# Altium schematic symbol library IC.SchLib: 555 symbols (part 10 of 15)
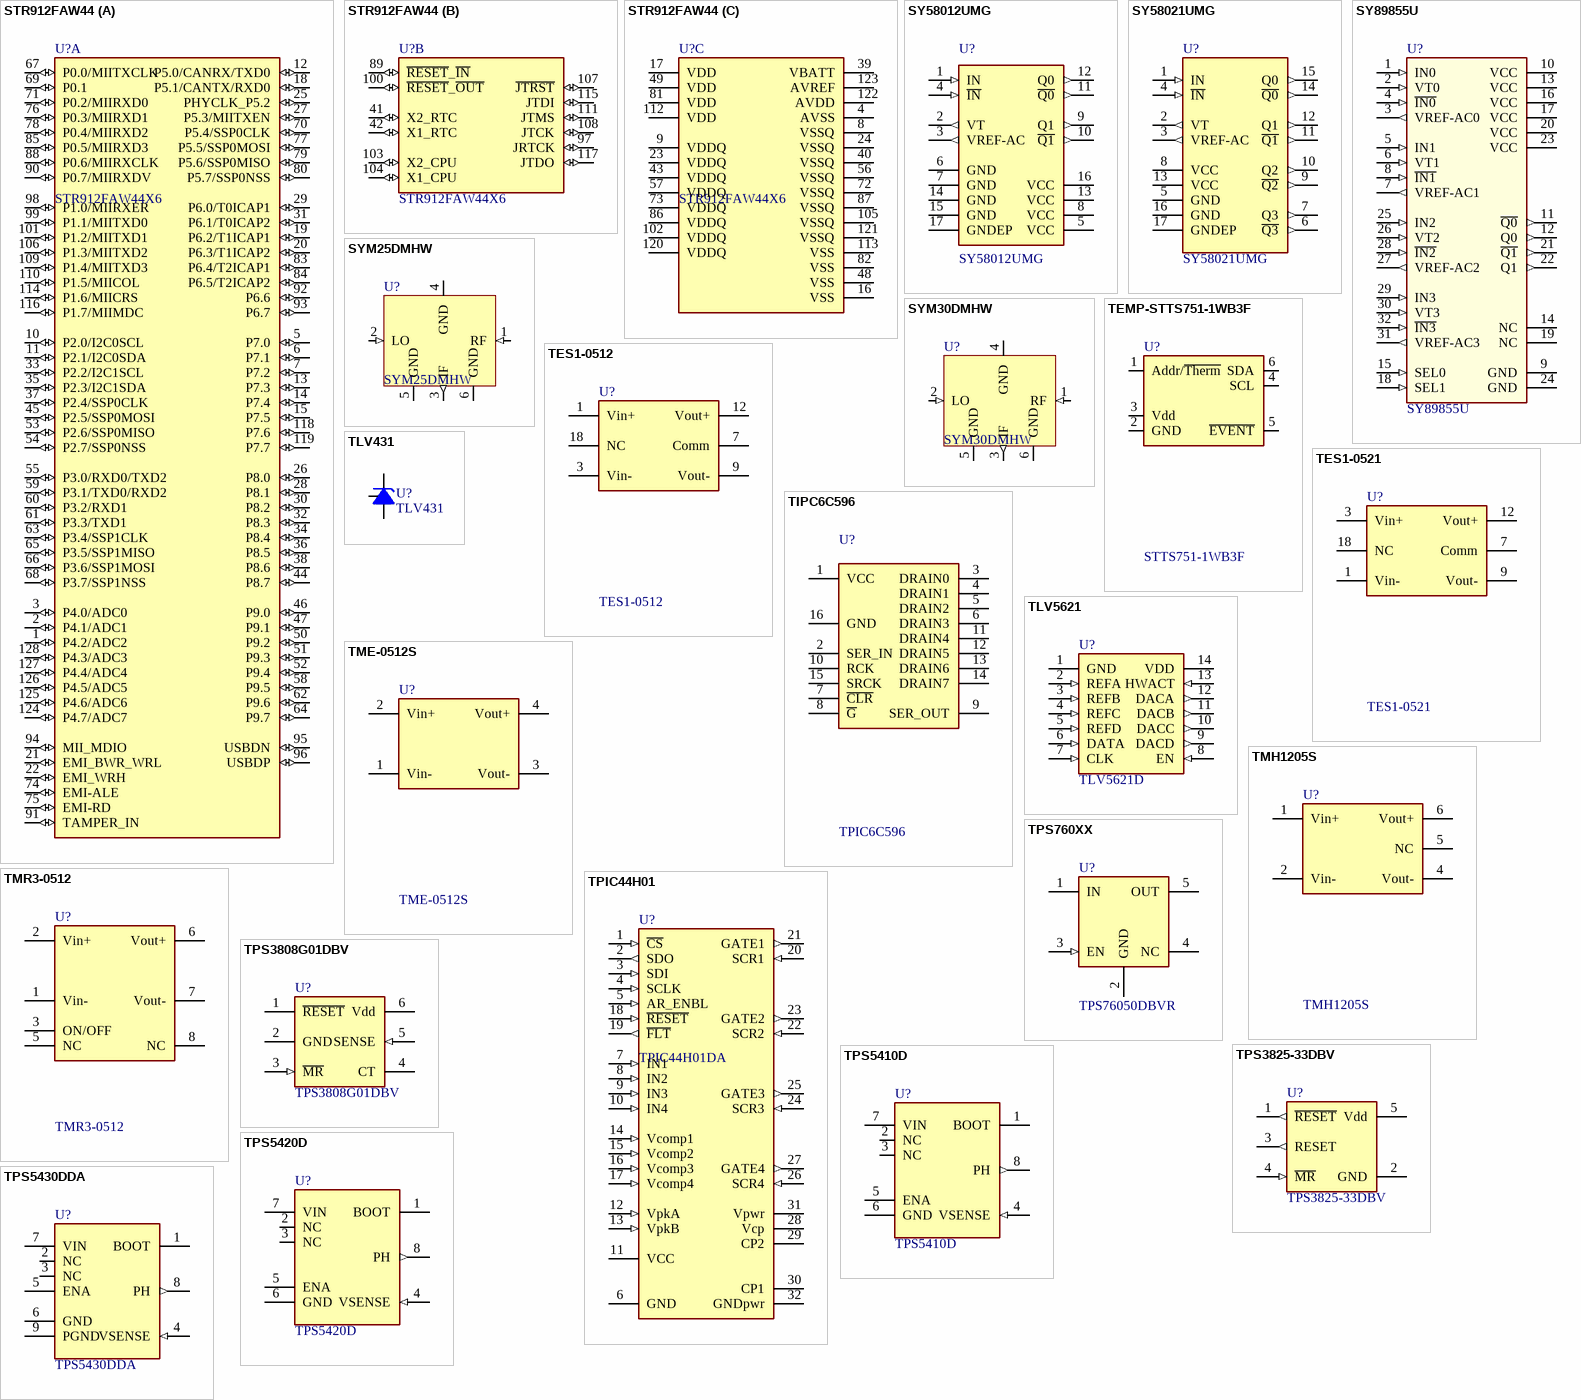
[diagram p79: symbols STR912FAW44 to TPS5430DDA]

## STR912FAW44
designator U?, comment STR912FAW44X6
ARM7 16/32-Bit Microcontroller, 512KB Flash, 96KB RAM, Ethernet, USB2, 128-Lead LQFP; Manufacturer: ST Microelectronics; Sort: 510; Tech: SMDR; Package: LQFP128; Manufacturer No: STR912FAW44X6; Price: 0
footprint TSQFP40P1600X1600X160-128N (TSQFP, 128-Leads, Body 16,2x16,2mm (max), Pitch 0,40mm, IPC Medium Density)
part A pins: 1 P4.2/ADC2 (io), 2 P4.1/ADC1 (io), 3 P4.0/ADC0 (io), 5 P7.0 (io), 6 P7.1 (io), 7 P7.2 (io), 10 P2.0/I2C0SCL (io), 11 P2.1/I2C0SDA (io), 12 P5.0/CANRX/TXD0 (io), 13 P7.3 (io), 14 P7.4 (io), 15 P7.5 (io), 18 P5.1/CANTX/RXD0 (io), 19 P6.2/T1ICAP1 (io), 20 P6.3/T1ICAP2 (io), 21 EMI_BWR_WRL (io), 22 EMI_WRH (io), 25 PHYCLK_P5.2 (io), 26 P8.0 (io), 27 P5.3/MIITXEN (io), 28 P8.1 (io), 29 P6.0/T0ICAP1 (io), 30 P8.2 (io), 31 P6.1/T0ICAP2 (io), 32 P8.3 (io), 33 P2.2/I2C1SCL (io), 34 P8.4 (io), 35 P2.3/I2C1SDA (io), 36 P8.5 (io), 37 P2.4/SSP0CLK (io), 38 P8.6 (io), 44 P8.7 (io), 45 P2.5/SSP0MOSI (io), 46 P9.0 (io), 47 P9.1 (io), 50 P9.2 (io), 51 P9.3 (io), 52 P9.4 (io), 53 P2.6/SSP0MISO (io), 54 P2.7/SSP0NSS (io), 55 P3.0/RXD0/TXD2 (io), 58 P9.5 (io), 59 P3.1/TXD0/RXD2 (io), 60 P3.2/RXD1 (io), 61 P3.3/TXD1 (io), 62 P9.6 (io), 63 P3.4/SSP1CLK (io), 64 P9.7 (io), 65 P3.5/SSP1MISO (io), 66 P3.6/SSP1MOSI (io), 67 P0.0/MIITXCLK (io), 68 P3.7/SSP1NSS (io), 69 P0.1 (io), 70 P5.4/SSP0CLK (io), 71 P0.2/MIIRXD0 (io), 74 EMI-ALE (io), 75 EMI-RD (io), 76 P0.3/MIIRXD1 (io), 77 P5.5/SSP0MOSI (io), 78 P0.4/MIIRXD2 (io), 79 P5.6/SSP0MISO (io), 80 P5.7/SSP0NSS (io), 83 P6.4/T2ICAP1 (io), 84 P6.5/T2ICAP2 (io), 85 P0.5/MIIRXD3 (io), 88 P0.6/MIIRXCLK (io), 90 P0.7/MIIRXDV (io), 91 TAMPER_IN (io), 92 P6.6 (io), 93 P6.7 (io), 94 MII_MDIO (io), 95 USBDN (io), 96 USBDP (io), 98 P1.0/MIIRXER (io), 99 P1.1/MIITXD0 (io), 101 P1.2/MIITXD1 (io), 106 P1.3/MIITXD2 (io), 109 P1.4/MIITXD3 (io), 110 P1.5/MIICOL (io), 114 P1.6/MIICRS (io), 116 P1.7/MIIMDC (io), 118 P7.6 (io), 119 P7.7 (io), 124 P4.7/ADC7 (io), 125 P4.6/ADC6 (io), 126 P4.5/ADC5 (io), 127 P4.4/ADC4 (io), 128 P4.3/ADC3 (io)
part B pins: 41 X2_RTC (io), 42 X1_RTC (io), 89 ~{RESET}_~{IN} (io), 97 JRTCK (io), 100 ~{RESET}_~{OUT} (io), 103 X2_CPU (io), 104 X1_CPU (io), 107 ~{JTRST} (io), 108 JTCK (io), 111 JTMS (io), 115 JTDI (io), 117 JTDO (io)
part C pins: 4 AVSS (power), 8 VSSQ (power), 9 VDDQ (power), 16 VSS (power), 17 VDD (power), 23 VDDQ (power), 24 VSSQ (power), 39 VBATT (power), 40 VSSQ (power), 43 VDDQ (power), 48 VSS (power), 49 VDD (power), 56 VSSQ (power), 57 VDDQ (power), 72 VSSQ (power), 73 VDDQ (power), 81 VDD (power), 82 VSS (power), 86 VDDQ (power), 87 VSSQ (power), 102 VDDQ (power), 105 VSSQ (power), 112 VDD (power), 113 VSS (power), 120 VDDQ (power), 121 VSSQ (power), 122 AVDD (power), 123 AVREF (power)

## SY58012UMG
designator U?
1:2 LVPECL fanout buffer / translator 2.5/3.3V; Manufacturer: Micrel; Sort: 510; Tech: SMDR; Manufacturer No: SY58012UMG; Package: MLF-16; Price: 0
footprint QFN16N-2 (QFN, 16-Leads, Body 3,0x3,0mm (max), Pitch 0,50mm, IPC Medium Density)
pins: 1 IN (in), 2 VT (out), 3 VREF-AC (out), 4 ~{IN} (in), 5 VCC (power), 6 GND (power), 7 GND (power), 8 VCC (power), 9 Q1 (out), 10 ~{Q1} (out), 11 ~{Q0} (out), 12 Q0 (out), 13 VCC (power), 14 GND (power), 15 GND (power), 16 VCC (power), 17 GNDEP (power)

## SY58021UMG
designator U?
1:4 LVPECL fanout buffer / translator 2.5/3.3V; Manufacturer: Micrel; Sort: 510; Tech: SMDR; Manufacturer No: SY58021UMG; Package: MLF-16 PREVERI!!!; Price: 0
footprint QFN16N-2 (QFN, 16-Leads, Body 3,0x3,0mm (max), Pitch 0,50mm, IPC Medium Density)
pins: 1 IN (in), 2 VT (out), 3 VREF-AC (out), 4 ~{IN} (in), 5 GND (power), 6 ~{Q3} (out), 7 Q3 (out), 8 VCC (power), 9 ~{Q2} (out), 10 Q2 (out), 11 ~{Q1} (out), 12 Q1 (out), 13 VCC (power), 14 ~{Q0} (out), 15 Q0 (out), 16 GND (power), 17 GNDEP (power)

## SY89855U
designator U?
Diff LVPECL 4:1 MUX with 1:2 Fanout and Internal Termination; Manufacturer: Micrel; Manufacturer No: SY89855UMG; Sort: 510; Tech: SMDR; Package: MLF32; Price: 0
footprint MLF32-1 (MLF 32pin W5.0x5.0mm H0.85mm R0.5mm  PP 3.1x3.1mm)
pins: 1 IN0 (in), 2 VT0 (in), 3 VREF-AC0 (out), 4 ~{IN0} (in), 5 IN1 (in), 6 VT1 (in), 7 VREF-AC1 (out), 8 ~{IN1} (in), 9 GND (power), 10 VCC (power), 11 ~{Q0} (out), 12 Q0 (out), 13 VCC (power), 14 NC, 15 SEL0 (in), 16 VCC (power), 17 VCC (power), 18 SEL1 (in), 19 NC, 20 VCC (power), 21 ~{Q1} (out), 22 Q1 (out), 23 VCC (power), 24 GND (power), 25 IN2 (in), 26 VT2 (in), 27 VREF-AC2 (out), 28 ~{IN2} (in), 29 IN3 (in), 30 VT3 (in), 31 VREF-AC3 (out), 32 ~{IN3} (in)

## SYM25DMHW
designator U?
Mixer, Level 13 (LO Power +13dBm) 40 to 2500MHz; Manufacturer: MiniCircuits; Sort: 510; Tech: SMDR; Manufacturer No: SYM25DMHW; Price: 0
footprint SYM30
pins: 1 RF (in), 2 LO (in), 3 IF (out), 4 GND (power), 5 GND (power), 6 GND (power)

## SYM30DMHW
designator U?
Frequency mixer 5-3000MHz Level 13; Manufacturer: MiniCircuits; Manufacturer No: SYM30DMHW+; Sort: 510; Tech: SMDR; Package: RF modul TTT167; Price: 0
footprint SYM30
pins: 1 RF (in), 2 LO (in), 3 IF (out), 4 GND (power), 5 GND (power), 6 GND (power)
1 alternate drawing of the same symbol

## TEMP-STTS751-1WB3F
designator U?, comment STTS751-1WB3F
2.25 V low-voltage local digital temperature sensor; Manufacturer: STMelectronics; Comment2: 2.25 to 3.6Vin; Sort: 510; Tech: SMDR; Manufacturer No: STTS751-1WB3F; Package: SOT23-6; Price: 1.8; Supplier: Digi-Key; Supplier No: 497-10662-1-ND
footprint SOT23-6
pins: 1 Addr/~{Therm}, 2 GND, 3 Vdd, 4 SCL, 5 ~{EVENT}, 6 SDA

## TES1-0512
designator U?
DC/DC converter, TES series, 1W Dual Output; Manufacturer: Traco Power; Sort: 510; Tech: SMDR; Manufacturer No: TES 1-0512; Price: 0
footprint TES1-0521 (TMH1205S 5 pin, Body 19.5x7.5x10.2mm (LxWxH), Pitch 2,54mm)
pins: 1 Vin+ (power), 3 Vin- (power), 7 Comm (power), 9 Vout- (power), 12 Vout+ (power), 18 NC

## TES1-0521
designator U?
DC/DC converter, TES series, 1W Dual Output; Manufacturer: Traco Power; Sort: 510; Tech: SMDR; Manufacturer No: TES 1-0521; Price: 0
footprint TES1-0521 (TMH1205S 5 pin, Body 19.5x7.5x10.2mm (LxWxH), Pitch 2,54mm)
pins: 1 Vin- (power), 3 Vin+ (power), 7 Comm (power), 9 Vout- (power), 12 Vout+ (power), 18 NC

## TIPC6C596
designator U?, comment TPIC6C596
Power Logic 8-Bit Shift Register; Manufacturer: Texas Instruments; Manufacturer No: TPIC6C596DG4; Sort: 510; Tech: SMDR; Package: SOIC16; Price: 0.4
footprint SOIC16-1 (Small IC 16 pin)
pins: 1 VCC, 2 SER_IN, 3 DRAIN0, 4 DRAIN1, 5 DRAIN2, 6 DRAIN3, 7 ~{CLR}, 8 ~{G}, 9 SER_OUT, 10 RCK, 11 DRAIN4, 12 DRAIN5, 13 DRAIN6, 14 DRAIN7, 15 SRCK, 16 GND

## TLV431
designator U?
Manufacturer: Texas; Manufacturer No: TLV431CDBVR; Comment2: 1.5%; Sort: 510; Tech: SMDR; Package: SOT23-5; Price: 0
footprint SOT23-5
pins: 3 C, 4 REF, 5 A

## TLV5621
designator U?, comment TLV5621D
DAC 8bit 4channel; Manufacturer: Texas; Manufacturer No: TLV5621ID; Comment2: 2.7-5.5V; Sort: 510; Tech: SMDR; Package: SOIC14; Price: 0
footprint SOIC14-1 (Small IC 14 pin)
footprint SOIC14-2 (SOIC, 14-Leads, Body 8,6x3,9mm (max), Pitch 1,27mm, IPC High Density)
pins: 1 GND (power), 2 REFA (in), 3 REFB (in), 4 REFC (in), 5 REFD (in), 6 DATA (in), 7 CLK (in), 8 EN (in), 9 DACD (out), 10 DACC (out), 11 DACB (out), 12 DACA (out), 13 HWACT (in), 14 VDD (power)

## TME-0512S
designator U?
DC/DC converter, TME series, 1W Single; Manufacturer: Traco Power, Farnell; Manufacturer No: TME 0512S, 1007540; Sort: 510; Tech: SMDR; Price: 0
footprint TME0512S (TME0512S 4 pin, Body 11.5x6x10.2mm (LxWxH), Pitch 2,54mm)
pins: 1 Vin- (power), 2 Vin+ (power), 3 Vout- (power), 4 Vout+ (power)

## TMH1205S
designator U?
DC/DC converter, TMH series, 2W; Manufacturer: Traco Power; Sort: 510; Tech: SMDR; Manufacturer No: TMH 1205S; Price: 0
footprint TMH1205S (TMH1205S 5 pin, Body 19.5x7.5x10.2mm (LxWxH), Pitch 2,54mm)
pins: 1 Vin+ (power), 2 Vin- (power), 4 Vout- (power), 5 NC, 6 Vout+ (power)

## TMR3-0512
designator U?
DC/DC converter, TMR series, 3W; Manufacturer: Traco Power; Comment2: 4.5-9V Vin, 12VDC, 250m; Sort: 510; Tech: TMDW; Manufacturer No: TMR 3-0512; Package: SIP-8; Price: 0
footprint SIP-8 (SIP 8pin, Body 21.8x9.2x11.1mm (LxWxH), R2,54mm)
pins: 1 Vin- (power), 2 Vin+ (power), 3 ON/OFF, 5 NC, 6 Vout+ (power), 7 Vout- (power), 8 NC

## TPIC44H01
designator U?, comment TPIC44H01DA
4 channel high side fet driver - serial and parallel; Manufacturer: Texas Instruments; Manufacturer No: TPIC44H01DAG4; Comment2: Vpwr 40V, Vcc 5V; Sort: 510; Tech: SMDR; Package: TSSOP32; Price: 2
footprint TSSOP32 (TSSOP, 32-Leads, Body 11,1x6,2mm (max), Pitch 0,65mm, IPC Medium Density)
pins: 1 ~{CS} (in), 2 SDO (out), 3 SDI (in), 4 SCLK (in), 5 AR_ENBL (in), 6 GND (power), 7 IN1 (in), 8 IN2 (in), 9 IN3 (in), 10 IN4 (in), 11 VCC (power), 12 VpkA (in), 13 VpkB (in), 14 Vcomp1 (in), 15 Vcomp2 (in), 16 Vcomp3 (in), 17 Vcomp4 (in), 18 ~{RESET} (in), 19 ~{FLT} (out), 20 SCR1 (in), 21 GATE1 (out), 22 SCR2 (in), 23 GATE2 (out), 24 SCR3 (in), 25 GATE3 (out), 26 SCR4 (in), 27 GATE4 (out), 28 Vcp (power), 29 CP2 (power), 30 CP1 (power), 31 Vpwr (power), 32 GNDpwr (power)

## TPS760XX
designator U?, comment TPS76050DBVR
LOW DROP REGULATOR 0.05A SOT23-5; Manufacturer: Texas Instruments; Sort: 510; Tech: SMDR; Package: SOT23-5; Price: 0
footprint SOT23-5
pins: 1 IN (power), 2 GND (power), 3 EN (in), 4 NC, 5 OUT (power)

## TPS3808G01DBV
designator U?
Programmable delay Supervisory circuit, SOT23-6; Manufacturer: Texas Instruments; Manufacturer No: TPS3808G01DBVTG4; Sort: 510; Tech: SMDR; Package: SOT23-6; Price: 0
footprint SOT23-6
pins: 1 ~{RESET} (oc), 2 GND (power), 3 ~{MR} (in), 4 CT, 5 SENSE (in), 6 Vdd (power)

## TPS3825-33DBV
designator U?
Fixed 200ms delay Supervisory circuit, SOT23-5; Manufacturer: Texas Instruments; Manufacturer No: TPS3825-33DBVTG4; Sort: 510; Tech: SMDR; Package: SOT23-5; Price: 0
footprint SOT23-5
pins: 1 ~{RESET} (out), 2 GND (power), 3 RESET (out), 4 ~{MR} (in), 5 Vdd (power)

## TPS5410D
designator U?
Step down converter 1A SOIC8; Manufacturer: Texas Instruments; Manufacturer No: TPS5410DG4; Sort: 510; Tech: SMDR; Package: SOIC8; Price: 0
footprint SOIC8-1
pins: 1 BOOT, 2 NC, 3 NC, 4 VSENSE (in), 5 ENA, 6 GND (power), 7 VIN (power), 8 PH (out)

## TPS5420D
designator U?
Step down converter 2A SOIC8; Manufacturer: Texas Instruments; Manufacturer No: TPS5420DG4; Sort: 510; Tech: SMDR; Package: SOIC8; Price: 0
footprint SOIC8-1
pins: 1 BOOT, 2 NC, 3 NC, 4 VSENSE (in), 5 ENA, 6 GND (power), 7 VIN (power), 8 PH (out)

## TPS5430DDA
designator U?
Step down converter 3A SOIC8PP; Manufacturer: Texas Instruments; Manufacturer No: TPS5430DDAG4; Sort: 510; Tech: SMDR; Package: SOIC8 PowerPad; Price: 0
footprint SOIC8PP-1
pins: 1 BOOT, 2 NC, 3 NC, 4 VSENSE (in), 5 ENA, 6 GND (power), 7 VIN (power), 8 PH (out), 9 PGND (power)

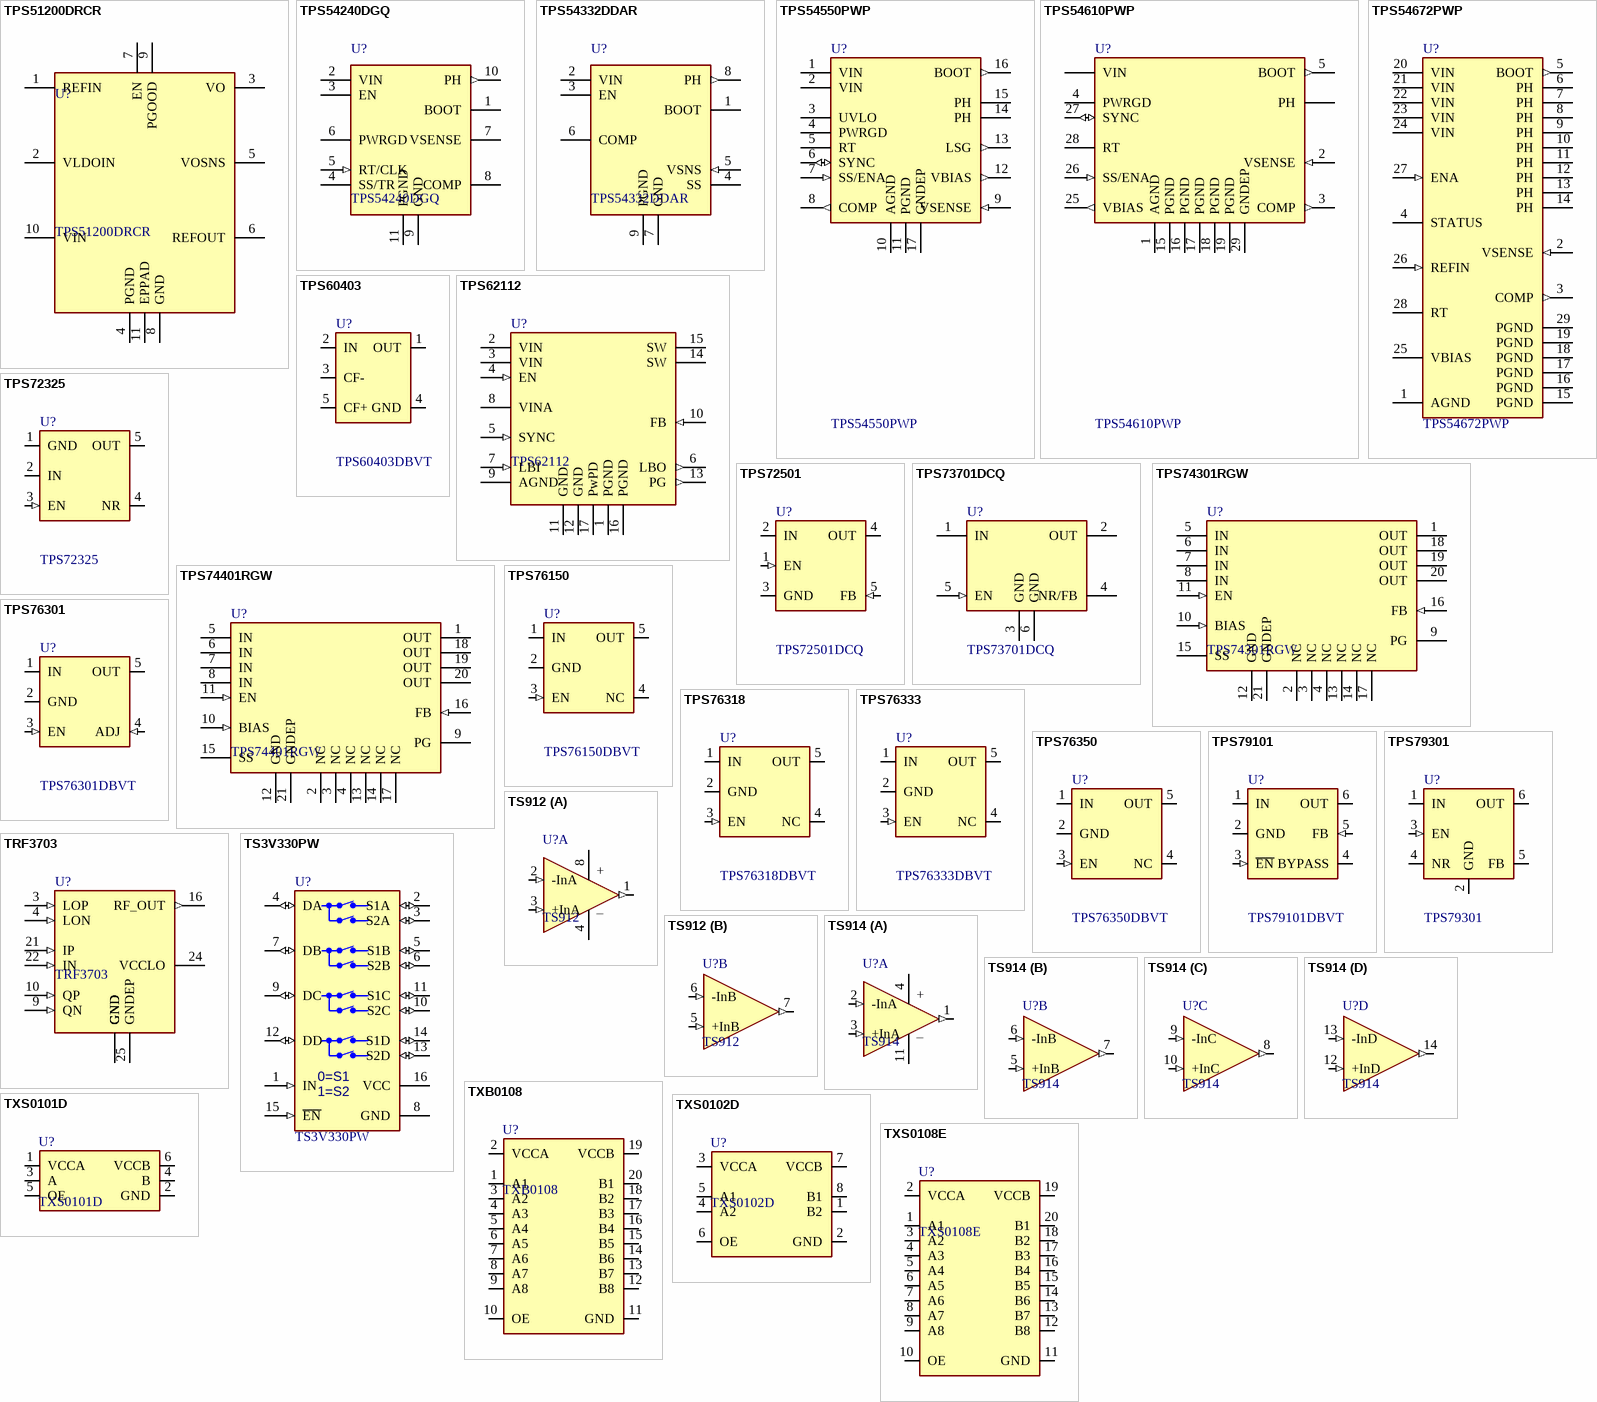
[diagram p41: symbols TPS51200DRCR to TXS0108E]

## TPS51200DRCR
designator U?
Sink/Source DDR Termination Regulator; Manufacturer: Texas Instruments, Digi-Key; Manufacturer No: TPS51200DRCR, 296-26978-1-ND; Sort: 510; Tech: SMDR; Package: 10-SON; Price: 2.63
footprint SON-10 (TPS52100 package 3x3x1 mm)
pins: 1 REFIN, 2 VLDOIN, 3 VO, 4 PGND, 5 VOSNS, 6 REFOUT, 7 EN, 8 GND, 9 PGOOD, 10 VIN, 11 EPPAD

## TPS54240DGQ
designator U?
Step down converter 2.5A MSOP10PP; Manufacturer: Texas Instruments; Comment2: 3.5-42Vin, 2.5A, 0.1-2.5MHz, 0.8-40Vout; Sort: 510; Tech: SMDR; Manufacturer No: TPS54240DGQ; Package: MSOP10 PowerPad; Price: 0
footprint MSOP10PP (MSOP 10pin with power pad)
pins: 1 BOOT, 2 VIN (power), 3 EN, 4 SS/TR, 5 RT/CLK (in), 6 PWRGD, 7 VSENSE, 8 COMP, 9 GND (power), 10 PH (out), 11 PGND (power)

## TPS54332DDAR
designator U?
Step down converter 3.5A SOIC8PP; Manufacturer: Texas Instruments; Comment2: 3.5-28Vin, 3.5A, 1MHz, 0.8-25Vout; Sort: 510; Tech: SMDR; Manufacturer No: TPS54332DDAR; Package: SOIC8 PowerPad; Price: 0
footprint SOIC8PP-1
pins: 1 BOOT, 2 VIN (power), 3 EN, 4 SS, 5 VSNS (in), 6 COMP, 7 GND (power), 8 PH (out), 9 PGND (power)

## TPS54550PWP
designator U?
4.5V to 20V input,  6A output synchronous PWM switcher; Manufacturer: Texas Instruments; Comment2: 6A 6Vin; Sort: 510; Tech: SMDR; Manufacturer No: TPS54550PWP; Package: HTTSOP28; Price: 0
footprint TSOP65P640X120_HS-16N (TSOP, 16-Leads, Body 5,1x4,5mm (max), Pitch 0,65mm, IPC Medium Density)
pins: 1 VIN (power), 2 VIN (power), 3 UVLO, 4 PWRGD (oc), 5 RT, 6 SYNC (io), 7 SS/ENA (in), 8 COMP (out), 9 VSENSE (in), 10 AGND (power), 11 PGND (power), 12 VBIAS (out), 13 LSG (out), 14 PH (power), 15 PH (power), 16 BOOT (out), 17 GNDEP (power)

## TPS54610PWP
designator U?
3V to 6V input, 6A output synchronous buck pwm  switcher with itegrated FET; Manufacturer: Texas Instruments; Comment2: 6A 6Vin; Sort: 510; Tech: SMDR; Manufacturer No: TPS54610PWP; Package: HTTSOP28; Price: 0
footprint TSOP65P640X120_HS-28L (TSOP, 28-Leads, Body 9,8x4,5mm, Pitch 0,65mm, IPC High Density)
pins: 1 AGND (power), 2 VSENSE (in), 3 COMP (out), 4 PWRGD (oc), 5 BOOT (out), 6 PH (power), 7 PH (power), 8 PH (power), 9 PH (power), 10 PH (power), 11 PH (power), 12 PH (power), 13 PH (power), 14 PH (power), 15 PGND (power), 16 PGND (power), 17 PGND (power), 18 PGND (power), 19 PGND (power), 20 VIN (power), 21 VIN (power), 22 VIN (power), 23 VIN (power), 24 VIN (power), 25 VBIAS (out), 26 SS/ENA (in), 27 SYNC (io), 28 RT, 29 GNDEP (power)

## TPS54672PWP
designator U?
Active bus termination switcher 6A, synchronous pwm; Manufacturer: Texas Instruments; Manufacturer No: TPS54672PWPG4; Comment2: 6A 6Vin; Sort: 510; Tech: SMDR; Package: HTTSOP28; Price: 0
footprint TSOP65P640X120_HS-28L (TSOP, 28-Leads, Body 9,8x4,5mm (max), Pitch 0,65mm, IPC High Density)
pins: 1 AGND (power), 2 VSENSE (in), 3 COMP (out), 4 STATUS (oc), 5 BOOT (out), 6 PH (power), 7 PH (power), 8 PH (power), 9 PH (power), 10 PH (power), 11 PH (power), 12 PH (power), 13 PH (power), 14 PH (power), 15 PGND (power), 16 PGND (power), 17 PGND (power), 18 PGND (power), 19 PGND (power), 20 VIN (power), 21 VIN (power), 22 VIN (power), 23 VIN (power), 24 VIN (power), 25 VBIAS, 26 REFIN (in), 27 ENA (in), 28 RT, 29 PGND (power)

## TPS60403
designator U?, comment TPS60403DBVT
Unregulated charge pump voltage inverter; Manufacturer: Texas Instruments, Farnell; Manufacturer No: TPS60403DBVT, 8457786; Comment2: 250KHz 60mA 1uF; Sort: 510; Tech: SMDR; Package: SOT23-5; Price: 0
footprint SOT23-5
pins: 1 OUT (power), 2 IN (power), 3 CF-, 4 GND (power), 5 CF+

## TPS62112
designator U?
17-V 1.5-A SYNCHRONOUS STEP-DOWN CONVERTER; Manufacturer: Texas Instruments; Manufacturer No: TPS62112RSAT; Sort: 550; Tech: SMDR; Package: QFN16; Price: 0
footprint QFN65P400X400X100-16N (QFN 4x4mm 16pin R0.65mm)
pins: 1 PGND (power), 2 VIN (power), 3 VIN (power), 4 EN (in), 5 SYNC (in), 6 LBO (out), 7 LBI (in), 8 VINA (power), 9 AGND (power), 10 FB (in), 11 GND (power), 12 GND (power), 13 PG (out), 14 SW (power), 15 SW (power), 16 PGND (power), 17 PwPD

## TPS72325
designator U?
-2.5V 0.2A Low drop regulator, Negative output SOT23-5; Manufacturer: Texas Instruments; Manufacturer No: TPS76150DBVT; Comment2: -2.5Vout, -11-+0.7Vin, 0.2A; Sort: 510; Tech: SMDR; Package: SOT23-5; Price: 0
footprint SOT23-5
pins: 1 GND (power), 2 IN (power), 3 EN (in), 4 NR, 5 OUT (power)

## TPS72501
designator U?, comment TPS72501DCQ
Low drop regulator 1A; Manufacturer: Texas Instruments; Manufacturer No: TPS72501DCQG4; Comment2: 1.2-5Vout, 1.8-6Vin, 0.17Vdrop, 1A; Sort: 510; Tech: SMDR; Package: SOT223-5; Price: 0
footprint SOT223-5 (SOT223, 5+1 Leads, Body 6,6x7,3mm (max), Pitch 1,27mm, IPC Medium Density)
pins: 1 EN (in), 2 IN (power), 3 GND (power), 4 OUT (power), 5 FB (in), 6 GND (power)

## TPS73701DCQ
designator U?
Adj. 1A Low-Dropout Regulator  with Reverse Current Protection; Manufacturer: Texas Instruments; Comment2: Adjustable from 1.2V; Sort: 510; Tech: SMDR; Manufacturer No: TPS73701DCQ; Package: SOT223-5; Price: 0
footprint SOT223-5 (SOT223, 5+1 Leads, Body 6,6x7,3mm (max), Pitch 1,27mm, IPC Medium Density)
pins: 1 IN (power), 2 OUT (power), 3 GND (power), 4 NR/FB, 5 EN (in), 6 GND (power)

## TPS74301RGW
designator U?
1.5A Ultra-LDO with Programmable Sequencing; Manufacturer: Texas Instruments; Comment2: adjustable from 1.2V; Sort: 550; Tech: SMDR; Manufacturer No: TPS74301RGW; Package: QFN20; Price: 0
footprint QFN65P500X500X100-20M (QFN, 20-Leads, Body 5,0x5,0mm (max), Pitch 0,65mm, IPC Low Density)
pins: 1 OUT (power), 2 NC, 3 NC, 4 NC, 5 IN (power), 6 IN (power), 7 IN (power), 8 IN (power), 9 PG (oc), 10 BIAS (in), 11 EN (in), 12 GND (power), 13 NC, 14 NC, 15 SS, 16 FB (in), 17 NC, 18 OUT (power), 19 OUT (power), 20 OUT (power), 21 GNDEP (power)

## TPS74401RGW
designator U?
3A Ultra-LDO with Programmable Sequencing; Manufacturer: Texas Instruments, Digikey; Manufacturer No: TPS74401RGW, 296-19893-1-ND; Comment2: Uin5.5Vmax, I=3A, Udo=0.12V; Sort: 550; Tech: SMDR; Package: QFN20; Price: 0
footprint QFN65P500X500X100-20M (QFN, 20-Leads, Body 5,0x5,0mm (max), Pitch 0,65mm, IPC Low Density)
pins: 1 OUT (power), 2 NC, 3 NC, 4 NC, 5 IN (power), 6 IN (power), 7 IN (power), 8 IN (power), 9 PG (oc), 10 BIAS (in), 11 EN (in), 12 GND (power), 13 NC, 14 NC, 15 SS, 16 FB (in), 17 NC, 18 OUT (power), 19 OUT (power), 20 OUT (power), 21 GNDEP (power)

## TPS76150
designator U?, comment TPS76150DBVT
5.0V 0.1A Low drop regulator SOT23-5; Manufacturer: Texas Instruments; Comment2: 5Vout, 3.5-16Vin, 0.1A; Sort: 510; Tech: SMDR; Manufacturer No: TPS76150DBVT; Package: SOT23-5; Price: 0
footprint SOT23-5
pins: 1 IN (power), 2 GND (power), 3 EN (in), 4 NC, 5 OUT (power)

## TPS76301
designator U?, comment TPS76301DBVT
Adj. 0.15A Low drop regulator SOT23-5; Manufacturer: Texas Instruments; Comment2: adjVout, 3.5-16Vin, 0.15A; Sort: 510; Tech: SMDR; Manufacturer No: TPS76301DBVT; Package: SOT23-5; Price: 0
footprint SOT23-5
pins: 1 IN (power), 2 GND (power), 3 EN (in), 4 ADJ (in), 5 OUT (power)

## TPS76318
designator U?, comment TPS76318DBVT
1.8V 0.15A Low drop regulator SOT23-5; Manufacturer: Texas Instruments; Comment2: 1.8Vout, 3.5-16Vin, 0.15A; Sort: 510; Tech: SMDR; Manufacturer No: TPS76318DBVT; Package: SOT23-5; Price: 0
footprint SOT23-5
pins: 1 IN (power), 2 GND (power), 3 EN (in), 4 NC, 5 OUT (power)

## TPS76333
designator U?, comment TPS76333DBVT
3.3V 0.15A Low drop regulator SOT23-5; Manufacturer: Texas Instruments; Comment2: 3.3Vout, 3.5-16Vin, 0.15A; Sort: 510; Tech: SMDR; Manufacturer No: TPS76333DBVT; Package: SOT23-5; Price: 0
footprint SOT23-5
pins: 1 IN (power), 2 GND (power), 3 EN (in), 4 NC, 5 OUT (power)

## TPS76350
designator U?, comment TPS76350DBVT
5.0V 0.15A Low drop regulator SOT23-5; Manufacturer: Texas Instruments; Comment2: 5Vout, 3.5-16Vin, 0.15A; Sort: 510; Tech: SMDR; Manufacturer No: TPS76350DBVT; Package: SOT23-5; Price: 0
footprint SOT23-5
pins: 1 IN (power), 2 GND (power), 3 EN (in), 4 NC, 5 OUT (power)

## TPS79101
designator U?, comment TPS79101DBVT
Adj. Low drop regulator 0.1A SOT23-5; Manufacturer: Texas Instruments; Comment2: Adj. Vout, 0.1A; Sort: 510; Tech: SMDR; Manufacturer No: TPS79101DBVT; Package: SOT23-6; Price: 0
footprint SOT23-6
pins: 1 IN (power), 2 GND (power), 3 ~{EN} (in), 4 BYPASS, 5 FB (in), 6 OUT (power)

## TPS79301
designator U?
2.5V Ultralow-Noise High PSRR, fast RF 0.2A Low Drop out Linear regulator; Manufacturer: Texas Instruments; Manufacturer No: TPS79301DBVR; Comment2: 1.22 to 5.5Vout, 0-6Vin, 0.2A; Sort: 510; Tech: SMDR; Package: SOT23-6; Price: 0
footprint SOT23-6
pins: 1 IN (power), 2 GND (power), 3 EN (in), 4 NR, 5 FB, 6 OUT (power)

## TRF3703
designator U?
0.4 - 4 GHz Quadrature Modulator; Manufacturer: Texas Instruments; Manufacturer No: TRF370333; Sort: 510; Tech: SMDR; Package: GFN16; Price: 0
footprint QFN24-1 (QFN24; 24 Leads; Body Width 4.0 mm; Pitch 0.5 mm)
pins: 2 GND (power), 3 LOP (in), 4 LON (in), 5 GND (power), 8 GND (power), 9 QN (in), 10 QP (in), 11 GND (power), 12 GND (power), 14 GND (power), 16 RF_OUT (out), 17 GND (power), 19 GND (power), 20 GND (power), 21 IP (in), 22 IN (in), 23 GND (power), 24 VCCLO (power), 25 GNDEP (power)

## TS3V330PW
designator U?
Differential quad SPDT wide-bandwidth Video switch with low on-state resistance; Manufacturer: Texas; Comment2: 3.3V;; Sort: 510; Tech: SMDR; Manufacturer No: TS3V330PW; Package: TSSOP16; Price: 0
footprint TSSOP16 (TSSOP16 5x4.4mm R0.65mm)
pins: 1 IN (in), 2 S1A (io), 3 S2A (io), 4 DA (io), 5 S1B (io), 6 S2B (io), 7 DB (io), 8 GND (power), 9 DC (io), 10 S2C (io), 11 S1C (io), 12 DD (io), 13 S2D (io), 14 S1D (io), 15 ~{EN} (in), 16 VCC (power)
text: 0=S1; 1=S2

## TS912
designator U?
CMOS Dual Operational Amplifier, Rail-to-Rail; Manufacturer: ST; Manufacturer No: TS912AIDT; Comment2: 2.7..16V, 2mV offset, 1pA bias input current; Sort: 510; Tech: SMDR; Package: SOIC-8; Price: 0
footprint SOIC8-1
part A pins: 1 OutA (out), 2 -InA (in), 3 +InA (in), 4 V- (power), 8 V+ (power)
part B pins: 5 +InB (in), 6 -InB (in), 7 OutB (out)
part A text: +; _

## TS914
designator U?
CMOS Quad Operational Amplifier, Rail-to-Rail; Manufacturer: ST; Manufacturer No: TS914ID; Comment2: 2.7..16V, 2mV offset, 1pA bias input current; Sort: 510; Tech: SMDR; Package: SOIC-14; Price: 0
footprint SOIC14-1 (Small IC 14 pin)
part A pins: 1 OutA (out), 2 -InA (in), 3 +InA (in), 4 VCC+ (power), 11 VCC- (power)
part B pins: 5 +InB (in), 6 -InB (in), 7 OutB (out)
part C pins: 8 OutC (out), 9 -InC (in), 10 +InC (in)
part D pins: 12 +InD (in), 13 -InD (in), 14 OutD (out)
part A text: +; _

## TXB0108
designator U?
8-BIT BIDIRECTIONAL VOLTAGE-LEVEL TRANSLATOR FOR PUSH-PULL APPLICATIONS; Manufacturer: Texas Instruments. Farnell, Digi-Key; Manufacturer No: TXB0108PWR, 1494945, 296-21527-1-ND; Comment2: 1.2/5.0V 60MHz PushPull; Sort: 510; Tech: SMDR; Package: TSSOP; Price: 2.54
footprint TSSOP20N (TSSOP 20, Body 6,6x4,5mm, R0,65mm, IPC Medium Density)
pins: 1 A1, 2 VCCA, 3 A2, 4 A3, 5 A4, 6 A5, 7 A6, 8 A7, 9 A8, 10 OE, 11 GND, 12 B8, 13 B7, 14 B6, 15 B5, 16 B4, 17 B3, 18 B2, 19 VCCB, 20 B1

## TXS0101D
designator U?
1-BIT BIDIRECTIONAL VOLTAGE-LEVEL TRANSLATOR  FOR OPEN-DRAIN AND PUSH-PULL APPLICATIONS; Manufacturer: Texas Instruments, Digi-Key; Manufacturer No: TXS0101DBVR, 296-22863-1-ND; Comment2: 1.2/5.0V 24MHz PushPull/OpenDrain; Sort: 510; Tech: SMDR; Package: SOT23-6; Price: 2.54
footprint SOT23-6
pins: 1 VCCA, 2 GND, 3 A, 4 B, 5 OE, 6 VCCB

## TXS0102D
designator U?
2-BIT BIDIRECTIONAL VOLTAGE-LEVEL TRANSLATOR  FOR OPEN-DRAIN AND PUSH-PULL APPLICATIONS; Manufacturer: Texas Instruments. Farnell, Digi-Key; Manufacturer No: TXS0102DCUR, 1703315, 296-21931-1-ND; Comment2: 1.2/5.0V 60MHz PushPull/OpenDrain; Sort: 510; Tech: SMDR; Package: TSSOP; Price: 2.54
footprint TSSOP8-1 (TSSOP8 3x3mm R0.5mm)
pins: 1 B2, 2 GND, 3 VCCA, 4 A2, 5 A1, 6 OE, 7 VCCB, 8 B1

## TXS0108E
designator U?
8-BIT BIDIRECTIONAL VOLTAGE-LEVEL TRANSLATOR  FOR OPEN-DRAIN AND PUSH-PULL APPLICATIONS; Manufacturer: Texas Instruments. Farnell, Digi-Key; Manufacturer No: TXS0108EPWR, 1702548, 296-23011-1-ND; Comment2: 1.2/5.0V 60MHz PushPull/OpenDrain; Sort: 510; Tech: SMDR; Package: TSSOP; Price: 2.54
footprint TSSOP20N (TSSOP 20, Body 6,6x4,5mm, R0,65mm, IPC Medium Density)
pins: 1 A1, 2 VCCA, 3 A2, 4 A3, 5 A4, 6 A5, 7 A6, 8 A7, 9 A8, 10 OE, 11 GND, 12 B8, 13 B7, 14 B6, 15 B5, 16 B4, 17 B3, 18 B2, 19 VCCB, 20 B1

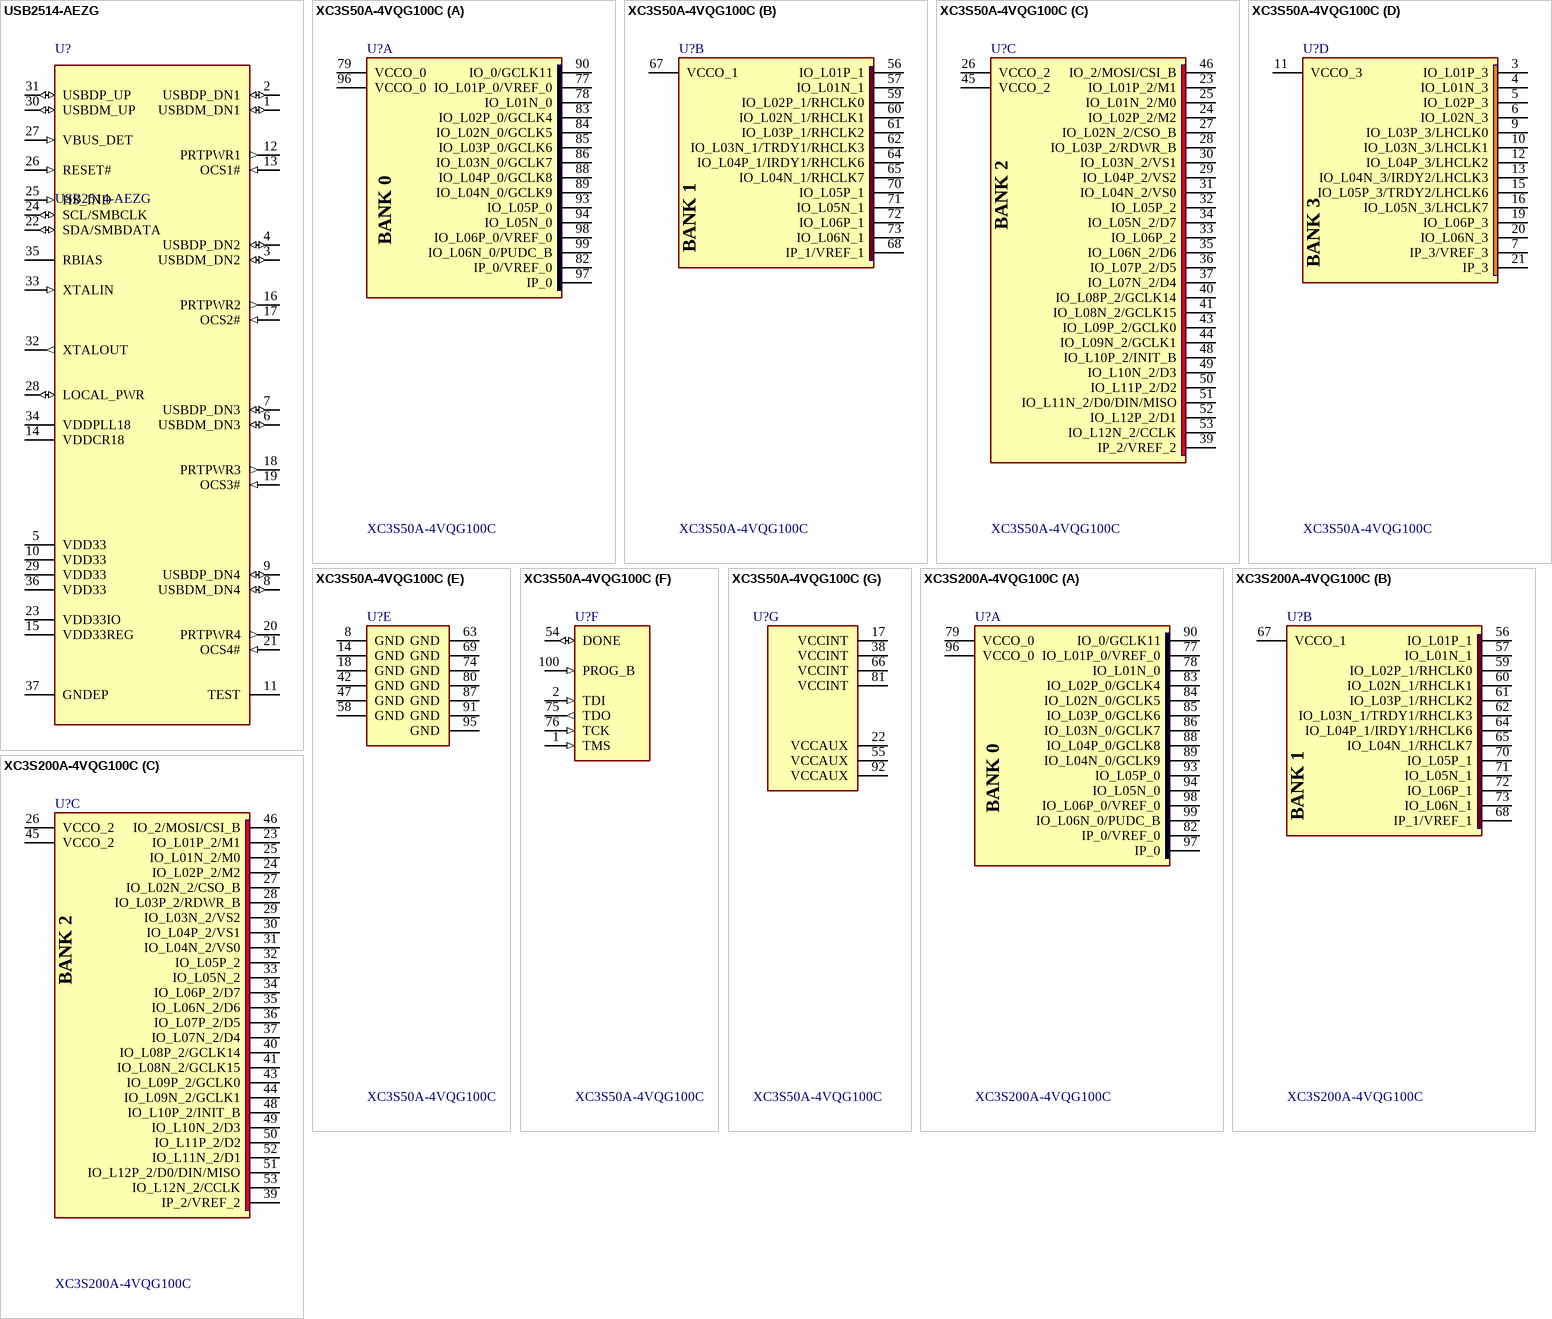
[diagram p42: symbols USB2514-AEZG to XC3S200A-4VQG100C]

## USB2514-AEZG
designator U?
4ch USB 2.0  HUB Controller; Manufacturer: SMSC, Digikey; Manufacturer No: USB2514-AEZG, 638-1054-ND; Comment2: 3.3V; Sort: 510; Tech: SMDR; Package: QFN36; Price: 4
footprint QFN50P600X600X100-36N (QFN, 36-Leads, Body 6,0x6,0mm (max), Pitch 0,50mm, IPC Medium Density)
pins: 1 USBDM_DN1 (io), 2 USBDP_DN1 (io), 3 USBDM_DN2 (io), 4 USBDP_DN2 (io), 5 VDD33 (power), 6 USBDM_DN3 (io), 7 USBDP_DN3 (io), 8 USBDM_DN4 (io), 9 USBDP_DN4 (io), 10 VDD33 (power), 11 TEST, 12 PRTPWR1 (out), 13 OCS1# (in), 14 VDDCR18, 15 VDD33REG (power), 16 PRTPWR2 (out), 17 OCS2# (in), 18 PRTPWR3 (out), 19 OCS3# (in), 20 PRTPWR4 (out), 21 OCS4# (in), 22 SDA/SMBDATA (io), 23 VDD33IO (power), 24 SCL/SMBCLK (io), 25 HS_IND (in), 26 RESET# (in), 27 VBUS_DET (in), 28 LOCAL_PWR (io), 29 VDD33 (power), 30 USBDM_UP (io), 31 USBDP_UP (io), 32 XTALOUT (out), 33 XTALIN (in), 34 VDDPLL18 (power), 35 RBIAS, 36 VDD33 (power), 37 GNDEP (power)

## XC3S50A-4VQG100C
designator U?
Spartan-3A FPGA, 68 User I/Os, 100-Pin Pb-Free VQG100, Standard(4), Commercial Grade; Manufacturer: Xilinx; Tech: SMDR; Sort: 510; Manufacturer No: XC3S50A-4VQG100C; Package: VQG100
footprint TSQFP50P1600X1600X145-100N (TSQFP, 100-Leads, Body 16,2x16,2mm (max), Pitch 0,50mm, IPC Medium Density)
part A pins: 77 IO_L01P_0/VREF_0, 78 IO_L01N_0, 79 VCCO_0 (power), 82 IP_0/VREF_0, 83 IO_L02P_0/GCLK4, 84 IO_L02N_0/GCLK5, 85 IO_L03P_0/GCLK6, 86 IO_L03N_0/GCLK7, 88 IO_L04P_0/GCLK8, 89 IO_L04N_0/GCLK9, 90 IO_0/GCLK11, 93 IO_L05P_0, 94 IO_L05N_0, 96 VCCO_0 (power), 97 IP_0, 98 IO_L06P_0/VREF_0, 99 IO_L06N_0/PUDC_B
part B pins: 56 IO_L01P_1, 57 IO_L01N_1, 59 IO_L02P_1/RHCLK0, 60 IO_L02N_1/RHCLK1, 61 IO_L03P_1/RHCLK2, 62 IO_L03N_1/TRDY1/RHCLK3, 64 IO_L04P_1/IRDY1/RHCLK6, 65 IO_L04N_1/RHCLK7, 67 VCCO_1 (power), 68 IP_1/VREF_1, 70 IO_L05P_1, 71 IO_L05N_1, 72 IO_L06P_1, 73 IO_L06N_1
part C pins: 23 IO_L01P_2/M1, 24 IO_L02P_2/M2, 25 IO_L01N_2/M0, 26 VCCO_2 (power), 27 IO_L02N_2/CSO_B, 28 IO_L03P_2/RDWR_B, 29 IO_L04P_2/VS2, 30 IO_L03N_2/VS1, 31 IO_L04N_2/VS0, 32 IO_L05P_2, 33 IO_L06P_2, 34 IO_L05N_2/D7, 35 IO_L06N_2/D6, 36 IO_L07P_2/D5, 37 IO_L07N_2/D4, 39 IP_2/VREF_2, 40 IO_L08P_2/GCLK14, 41 IO_L08N_2/GCLK15, 43 IO_L09P_2/GCLK0, 44 IO_L09N_2/GCLK1, 45 VCCO_2 (power), 46 IO_2/MOSI/CSI_B, 48 IO_L10P_2/INIT_B, 49 IO_L10N_2/D3, 50 IO_L11P_2/D2, 51 IO_L11N_2/D0/DIN/MISO, 52 IO_L12P_2/D1, 53 IO_L12N_2/CCLK
part D pins: 3 IO_L01P_3, 4 IO_L01N_3, 5 IO_L02P_3, 6 IO_L02N_3, 7 IP_3/VREF_3, 9 IO_L03P_3/LHCLK0, 10 IO_L03N_3/LHCLK1, 11 VCCO_3 (power), 12 IO_L04P_3/LHCLK2, 13 IO_L04N_3/IRDY2/LHCLK3, 15 IO_L05P_3/TRDY2/LHCLK6, 16 IO_L05N_3/LHCLK7, 19 IO_L06P_3, 20 IO_L06N_3, 21 IP_3
part E pins: 8 GND (power), 14 GND (power), 18 GND (power), 42 GND (power), 47 GND (power), 58 GND (power), 63 GND (power), 69 GND (power), 74 GND (power), 80 GND (power), 87 GND (power), 91 GND (power), 95 GND (power)
part F pins: 1 TMS (in), 2 TDI (in), 54 DONE (io), 75 TDO (out), 76 TCK (in), 100 PROG_B (in)
part G pins: 17 VCCINT (power), 22 VCCAUX (power), 38 VCCINT (power), 55 VCCAUX (power), 66 VCCINT (power), 81 VCCINT (power), 92 VCCAUX (power)
